# Altium footprint library devkit-visao.PcbLib: 48 footprints (part 3 of 3)
Each footprint in its own frame and in the unit in brackets; x right, y up, seen from the top. Pads: shape width x height; smd on the part's side, far side on the other; paste and mask are expansions set on the pad; w line width, h text height; cw(c..) or ccw(c..) is an arc to the next point about the centre after c.
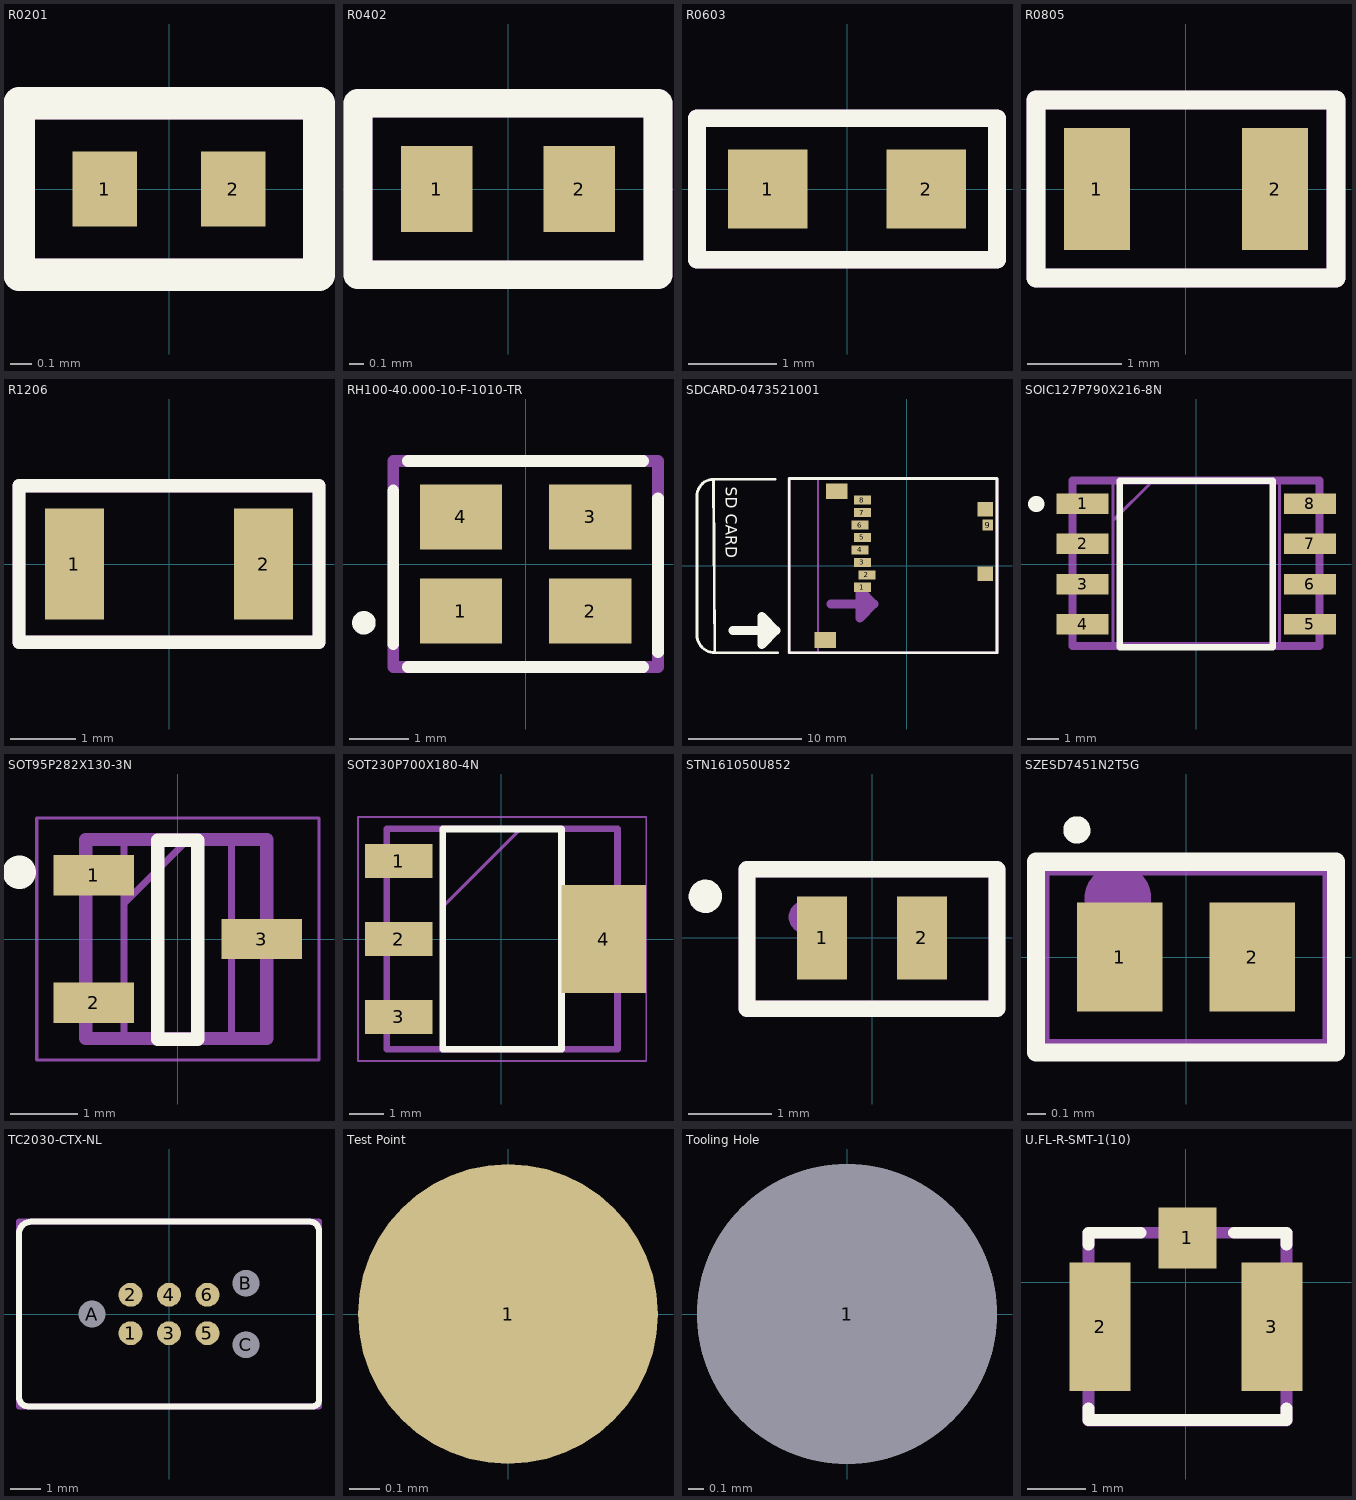
[diagram p2: the footprints below, top view; thin cyan lines are the x and y axes]

## R0201 [mm]
pads (2):
  rect 0.3x0.35 smd mask+0.06: 1(-0.3,0) 2(0.3,0)
Top Overlay:
  lines w0.15: -0.7,-0.4 -0.7,0.4 0.7,0.4 0.7,-0.4 -0.7,-0.4
Mechanical 29:
  lines w0.15: -0.7,-0.4 0.7,-0.4 0.7,0.4 -0.7,0.4 -0.7,-0.4
  text "'.Designator'" at -0.4,-0.1 h0.2
3D body "C0201.step": height 0.3, standoff 0, extent -0.3,-0.15 0.3,0.15

## R0402 [mm]
pads (2):
  rect 0.5x0.6 smd: 1(-0.5,0) 2(0.5,0)
Top Overlay:
  lines w0.2: -1.05,-0.6 1.05,-0.6 1.05,0.6 -1.05,0.6 -1.05,-0.6
Mechanical 29:
  lines w0.2: -1.05,-0.6 1.05,-0.6 1.05,0.6 -1.05,0.6 -1.05,-0.6
  text "'.Designator'" at -0.75,-0.223 h0.5
3D body "R0402.step": height 0.41, standoff 0.01, extent -0.5,-0.25 0.5,0.25

## R0603 [mm]
height 0.9
pads (2):
  rect 0.9x0.9 smd: 1(-0.9,0) 2(0.9,0)
Top Overlay:
  lines w0.2: -1.7,-0.8 -1.7,0.8 1.7,0.8 1.7,-0.8 -1.7,-0.8
Mechanical 29:
  lines w0.2: -1.7,-0.8 1.7,-0.8 1.7,0.8 -1.7,0.8 -1.7,-0.8
  text "'.Designator'" at -1.3,-0.4 h0.8
3D body "R0603.stp": height 0.46, standoff 0.01, extent -0.775,-0.4 0.775,0.4

## R0805 [mm]
pads (2):
  rect 0.7x1.3 smd: 1(-0.95,0) 2(0.95,0)
Top Overlay:
  lines w0.2: -1.6,-0.95 -1.6,0.95 1.6,0.95 1.6,-0.95 -1.6,-0.95
Mechanical 29:
  lines w0.2: -1.6,-0.95 -1.6,0.95 1.6,0.95 1.6,-0.95 -1.6,-0.95
  text "'.Designator'" at -0.6,-0.347 h0.85
3D body "R0805.step": height 0.61, standoff 0.01, extent -1,-0.6 1,0.6

## R1206 [mm]
pads (2):
  rect 0.9x1.7 smd: 1(-1.45,0) 2(1.45,0)
Top Overlay:
  lines w0.2: -2.3,-1.2 2.3,-1.2 2.3,1.2 -2.3,1.2 -2.3,-1.2
Mechanical 29:
  lines w0.2: -2.3,-1.2 -2.3,1.2 2.3,1.2 2.3,-1.2 -2.3,-1.2
  text "'.Designator'" at -1.5,-0.5 h1
3D body "R1206.stp": height 0.56, standoff 0.01, extent -1.6,-0.8 1.6,0.8

## RH100-40.000-10-F-1010-TR [mm]
pads (4):
  rect 1.4x1.1 smd: 1(-1.1,-0.8) 2(1.1,-0.8) 3(1.1,0.8) 4(-1.1,0.8)
Top Overlay:
  circle w0.2: c-2.75,-1 r0.1
  lines w0.2: -2.25,-1.366 -2.25,1.25 ; -2,-1.75 2,-1.75 ; -2,1.75 2,1.75 ; 2.25,-1.5 2.25,1.116
Mechanical 29:
  circle w0.2: c-1.25,-1 r0.1
  lines w0.2: -2.25,-1.75 -2.25,1.75 2.25,1.75 2.25,-1.75 -2.25,-1.75
  text "'.Designator'" at -2,-0.5 h1
3D body "SMD_0-F-1010-TR_RAL.step": height 0.71, standoff 0, extent -1.702,-1.37 1.702,1.37

## SDCARD-0473521001 [mm]
pads (13):
  rect 1.5x0.8 smd: 1(-3.897,-1.915) 2(-3.497,-0.815) 3(-3.897,0.285) 4(-4.097,1.385) 5(-3.897,2.485) 6(-4.097,3.585) 7(-3.897,4.685) 8(-3.897,5.785)
  rect 0.95x1 smd mask+0.051: 9(7.188,3.585)
  rect 1.9x1.4 smd: ""(-7.187,-6.575) ""(-6.187,6.575)
  rect 1.4x1.3 smd mask+0.051: ""(6.963,-0.725) ""(6.963,4.975)
Top Overlay:
  region: -12.807,-7.005 -12.807,-4.465 -11.537,-5.735
  lines w0.254: -16.951,-7.7 -11.4,-7.7 ; -11.637,7.635 -17.047,7.635 ; -17.047,7.635 ccw(c-17.047,6.16) -18.522,6.16 -18.522,-6.128 ccw(c-16.951,-6.128) -16.951,-7.699 -17.047,7.635 ; -10.372,-7.7 8,-7.7 8,7.7 -10.372,7.7 -10.372,-7.7
  lines w0.762: -15.347,-5.735 -12.807,-5.735 ; -12.807,-7.005 -12.807,-4.465 -11.537,-5.735 -12.807,-7.005
  text "SD CARD" at -15.982,6.965 h1.02
Mechanical 29:
  region: -4.142,-4.67 -4.142,-2.13 -2.872,-3.4
  lines w0.2: -7.833,-7.627 -7.833,7.75
  lines w0.254: -10.4,-7.7 -10.4,7.7 8,7.7 8,-7.7 -10.4,-7.7
  lines w0.762: -6.682,-3.4 -4.142,-3.4 ; -4.142,-4.67 -2.872,-3.4 -4.142,-2.13 -4.142,-4.67
  text "'.Designator'" at -6.1,-0.1 h1
3D body "473521001.stp": height 1.89, standoff 0.01, extent -7.8,-7.025 7.4,7.075
3D body "Micro SD Card White.step": height 1.85, standoff 0.74, extent -10.2,-4.199 4.827,6.85

## SOIC127P790X216-8N [mm]
pads (8):
  rect 1.65x0.65 smd: 1(-3.6,1.905) 2(-3.6,0.635) 3(-3.6,-0.635) 4(-3.6,-1.905) 5(3.6,-1.905) 6(3.6,-0.635) 7(3.6,0.635) 8(3.6,1.905)
Top Overlay:
  lines w0.2: -2.425,-2.64 -2.425,2.64 2.425,2.64 2.425,-2.64 -2.425,-2.64
  lines w0.5: -5.075,1.9 -5.05,1.9
Mechanical 13:
  lines w0.1: -2.64,1.37 -1.37,2.64 ; -2.64,-2.64 -2.64,2.64 2.64,2.64 2.64,-2.64 -2.64,-2.64
Mechanical 29:
  circle w0.254: c-3.15,1.875 r0.125
  lines w0.254: -3.925,-2.6 -3.925,2.65 3.9,2.65 3.9,-2.6 -3.925,-2.6
  text "'.Designator'" at -4.658,-0.031 h0.8
3D body "W25Q32JVSSIQ_TR.stp": height 2.16, standoff 0, extent -3.95,-2.64 3.95,2.64

## SOT95P282X130-3N [mm]
pads (3):
  rect 1.2x0.6 smd: 1(-1.25,0.95) 2(-1.25,-0.95) 3(1.25,0)
Top Overlay:
  lines w0.2: -0.302,-1.489 -0.302,1.471 0.298,1.471 0.298,-1.489 -0.302,-1.489
  lines w0.5: -2.362,0.991 -2.358,0.992
Mechanical 13:
  lines w0.1: -0.8,0.53 0.15,1.48 ; -0.8,-1.48 -0.8,1.48 0.8,1.48 0.8,-1.48 -0.8,-1.48
Mechanical 15:
  lines w0.05: -2.1,-1.8 -2.1,1.8 2.1,1.8 2.1,-1.8 -2.1,-1.8
Mechanical 29:
  circle w0.254: c-1,0.925 r0.075
  lines w0.2: -1.372,-1.48 -1.372,1.48 1.321,1.48 1.321,-1.48 -1.372,-1.48
  text "'.Designator'" at -1.168,-0.076 h0.2
3D body "AP2138N-1.8TRG1.stp": height 1.3, standoff 0, extent -1.412,-1.48 1.412,1.48

## SOT230P700X180-4N [mm]
pads (4):
  rect 2x1 smd: 1(-3.025,2.3) 2(-3.025,0) 3(-3.025,-2.3)
  rect 2.5x3.2 smd: 4(3.025,0)
Top Overlay:
  lines w0.2: -1.723,-3.252 -1.723,3.248 1.777,3.248 1.777,-3.252 -1.723,-3.252
Mechanical 13:
  lines w0.1: -1.725,0.95 0.575,3.25 ; -1.725,-3.25 -1.725,3.25 1.775,3.25 1.775,-3.25 -1.725,-3.25
Mechanical 15:
  lines w0.05: -4.225,-3.6 -4.225,3.6 4.275,3.6 4.275,-3.6 -4.225,-3.6
Mechanical 29:
  lines w0.2: -3.379,-3.25 3.429,-3.25 3.429,3.25 -3.379,3.25 -3.379,-3.25
  text "'.Designator'" at -2.54,-0.051 h0.5
3D body "AP2114H-3.3TRG1.stp": height 1.8, standoff 0, extent -3.475,-3.25 3.525,3.25

## STN161050U852 [mm]
pads (2):
  rect 0.6x1 smd mask+0.064: 1(-0.6,0) 2(0.6,0)
Top Overlay:
  circle w0.2: c-2,0.5 r0.1
  lines w0.2: -1.5,-0.85 -1.5,0.825 1.5,0.825 1.5,-0.85 -1.5,-0.85
Mechanical 29:
  circle w0.2: c-0.8,0.25 r0.1
  lines w0.2: -1.5,-0.85 -1.5,0.825 1.5,0.825 1.5,0.375 1.5,-0.375 1.5,-0.85 -1.5,-0.85
  text "'.Designator'" at -0.5,-0.5 h0.8
3D body "D1213A-01LP-7B v3.step": height 0.5, standoff 0, extent -0.537,-0.337 0.537,0.337

## SZESD7451N2T5G [mm]
pads (2):
  rect 0.47x0.6 smd mask+0.051: 1(-0.365,0) 2(0.365,0)
Top Overlay:
  lines w0.1: -0.578,0.711 ccw(c-0.6,0.7) -0.575,0.7 ; -0.825,-0.525 -0.825,0.525 0.825,0.525 0.825,-0.525 -0.825,-0.525
Mechanical 29:
  circle w0.254: c-0.375,0.325 r0.056
  lines w0.1: -0.8,-0.5 0.8,-0.5 0.8,0.5 -0.8,0.5 -0.8,-0.5
  text "'.Designator'" at -0.85,-0.275 h0.5
3D body "D1213A-01LP-7B v3.step": height 0.5, standoff 0, extent -0.537,-0.337 0.537,0.337

## TC2030-CTX-NL [mil]
pads (9):
  round 31 smd paste-19.68: 1(-50,-25) 2(-50,25) 3(0,-25) 4(0,25) 5(50,-25) 6(50,25)
  round 34 hole 35 unplated: A(-100,0) B(100,40) C(100,-40)
Top Overlay:
  lines w7.87: -195,-108.15 ccw(c-183.15,-108.15) -183.15,-120 187.09,-120 ccw(c187.09,-112.09) 195,-112.09 195,108.15 ccw(c183.15,108.15) 183.15,120 -179.21,120 ccw(c-179.21,104.21) -195,104.21 -195,-108.15
Mechanical 29:
  lines w7.87: -194.88,-120.08 195,-120.08 195,120.08 -194.88,120.08 -194.88,-120.08
  text "'.Designator'" at -82.68,-23.62 h33.46

## Test Point [mm]
pads (1):
  round 1 smd paste-1: 1(0,0)

## Tooling Hole [mm]
pads (1):
  round 2 hole 2 unplated: 1(0,0)

## U.FL-R-SMT-1(10) [mm]
pads (3):
  rect 1x1.05 smd mask+0.064: 1(0.025,0.763)
  rect 1.05x2.2 smd mask+0.064: 2(-1.475,-0.763) 3(1.475,-0.763)
Top Overlay:
  lines w0.2: -1.675,-2.163 -1.675,-2.362 1.725,-2.362 1.725,-2.163 ; -1.675,-2.163 -1.675,-2.163 ; -1.675,0.65 -1.675,0.85 -0.775,0.85 ; -1.675,0.65 -1.675,0.65 ; -0.775,0.85 -0.775,0.85 ; 0.825,0.85 1.725,0.85 1.725,0.65 ; 0.825,0.85 0.825,0.85 ; 1.725,-2.163 1.725,-2.163 ; 1.725,0.65 1.725,0.65
Mechanical 29:
  lines w0.2: -1.675,-2.375 -1.675,0.85 1.725,0.85 1.725,-2.375 -1.675,-2.375
  text "'.Designator'" at -0.875,-1.188 h0.8
3D body "U.FL-R-SMT-1.stp": height 1.26, standoff 0.01, extent -1.475,-2.337 1.525,0.763